# Altium footprint library WE Inductors.PcbLib: 131 footprints (part 2 of 9)
Each footprint in its own frame and in the unit in brackets; x right, y up, seen from the top. Pads: shape width x height; smd on the part's side, far side on the other; paste and mask are expansions set on the pad; w line width, h text height; cw(c..) or ccw(c..) is an arc to the next point about the centre after c.
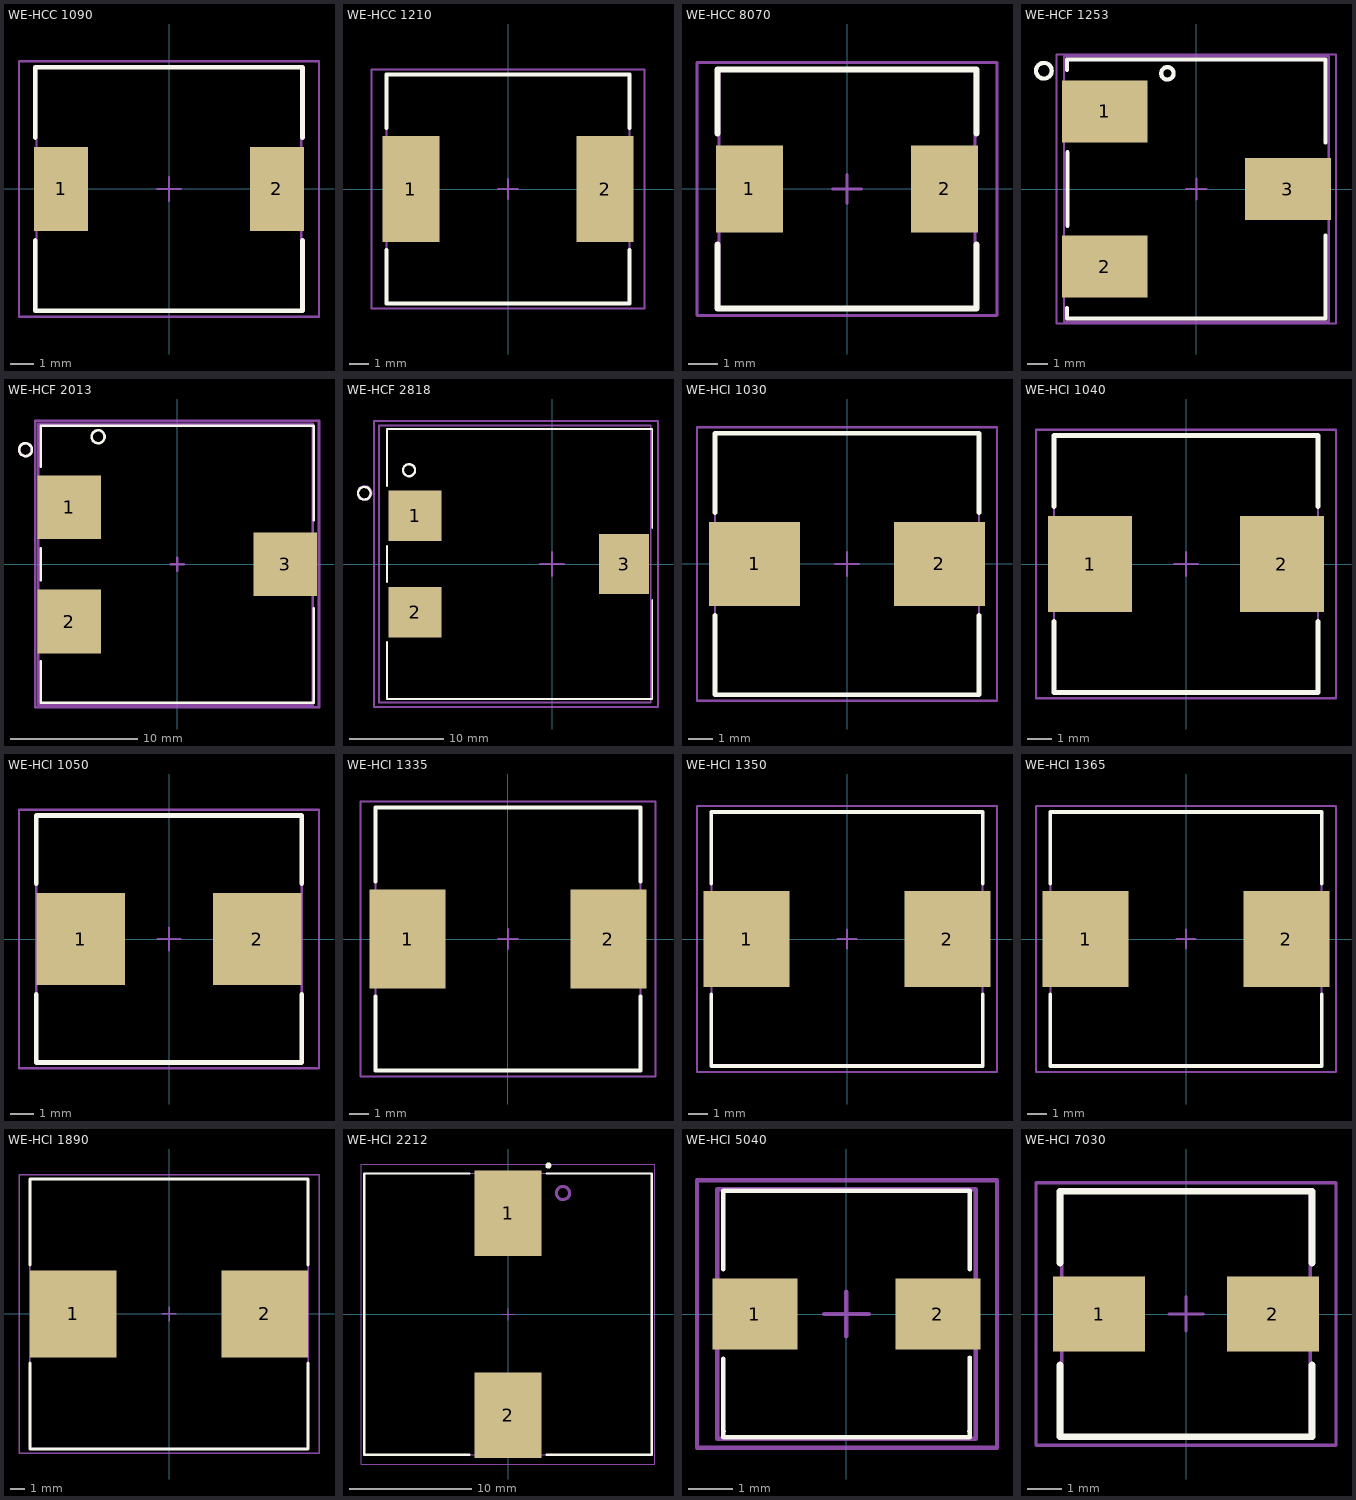
[diagram p1: the footprints below, top view; thin cyan lines are the x and y axes]

## WE-HCC 1090 [mm] "Inductor, 2-Leads, Body 10,9x10,0mm"
height 9.7
pads (2):
  rect 2.3x3.6 smd: 1(-4.6,0) 2(4.6,0)
Top Overlay:
  lines w0.2: -5.7,-2.2 -5.7,-5.2 5.7,-5.2 5.7,-2.2 ; -5.7,2.2 -5.7,5.2 5.7,5.2 5.7,2.2
Mechanical 13:
  lines w0.1: -5.65,-5.2 5.65,-5.2 5.65,5.2 -5.65,5.2 -5.65,-5.2
Mechanical 15:
  lines w0.1: -0.5,0 0.5,0 ; 0,-0.5 0,0.5 ; -6.4,-5.45 6.4,-5.45 6.4,5.45 -6.4,5.45 -6.4,-5.45
3D body: height 9.29, standoff -0.01, extent -5.125,-5 5.125,5

## WE-HCC 1210 [mm] "Inductor, 2-Leads, Body 12,1x11,4mm"
height 10
pads (2):
  rect 2.9x5.4 smd: 1(-4.95,0) 2(4.95,0)
Top Overlay:
  lines w0.2: -6.2,-3.1 -6.2,-5.85 6.2,-5.85 6.2,-3.1 ; -6.2,3.1 -6.2,5.85 6.2,5.85 6.2,3.1
Mechanical 13:
  lines w0.1: -6.2,-5.85 6.2,-5.85 6.2,5.85 -6.2,5.85 -6.2,-5.85
Mechanical 15:
  lines w0.1: -0.5,0 0.5,0 ; 0,-0.5 0,0.5 ; -6.95,-6.1 6.95,-6.1 6.95,6.1 -6.95,6.1 -6.95,-6.1
3D body: height 9.5, standoff 0, extent -6.05,-5.685 6.05,5.715

## WE-HCC 8070 [mm] "Inductor, 2-Leads, Body 8,4x7,9mm"
height 7.5
pads (2):
  rect 2.3x3 smd: 1(-3.35,0) 2(3.35,0)
Top Overlay:
  lines w0.2: -4.45,-1.9 -4.45,-4.1 4.45,-4.1 4.45,-1.9 ; -4.45,1.9 -4.45,4.1 4.45,4.1 4.45,1.9
Mechanical 13:
  lines w0.1: -4.4,-4.1 -4.4,4.1 4.4,4.1 4.4,-4.1 -4.4,-4.1
Mechanical 15:
  lines w0.1: -0.5,0 0.5,0 ; 0,-0.5 0,0.5 ; -5.15,-4.35 -5.15,4.35 5.15,4.35 5.15,-4.35 -5.15,-4.35
3D body: height 7.15, standoff -0.05, extent -4.2,-3.963 4.2,3.937

## WE-HCF 1253 [mm] "SMD Inductor, 3-Leads, Body 12.6x12.6mm (max)"
height 5.3
pads (3):
  rect 4.15x3 smd: 1(-4.425,3.75) 2(-4.425,-3.75) 3(4.425,0)
Top Overlay:
  circle w0.2: c-7.366,5.715 r0.381
  circle w0.2: c-1.397,5.588 r0.3
  lines w0.2: -6.25,-5.742 -6.25,-6.25 6.25,-6.25 6.25,-2.25 ; -6.25,5.742 -6.25,6.25 6.25,6.25 6.25,2.25 ; -6.223,-1.778 -6.223,1.778
Mechanical 13:
  lines w0.1: -6.4,-6.4 -6.4,6.4 6.4,6.4 6.4,-6.4 -6.4,-6.4
Mechanical 15:
  lines w0.1: -0.5,0 0.5,0 ; 0,-0.5 0,0.5 ; -6.75,-6.5 -6.75,6.5 6.75,6.5 6.75,-6.5 -6.75,-6.5
  text ".Designator" at 0,0 h0.76
3D body: height 5.1, standoff 0.1, extent -6.25,-6.25 6.25,6.25

## WE-HCF 2013 [mm] "SMD Inductor, 3-Leads, Body 21,8x21,5mm (max)"
height 14.5
pads (3):
  rect 5x5 smd: 1(-8.5,4.5) 2(-8.5,-4.5) 3(8.5,0)
Top Overlay:
  circle w0.2: c-6.223,10.033 r0.508
  circle w0.2: c-11.938,9.017 r0.508
  lines w0.2: -10.75,-7.62 -10.75,-10.9 10.75,-10.9 10.75,-3.45 ; -10.75,-1.27 -10.75,1.27 ; -10.75,7.665 -10.75,10.9 10.75,10.9 10.75,3.45
Mechanical 13:
  lines w0.2: -10.922,-11.049 -10.922,11.049 10.668,11.049 10.668,-11.049 -10.922,-11.049
Mechanical 15:
  circle w0.2: c-11.938,9.017 r0.508
  lines w0.2: -0.5,0 0.5,0 ; 0,-0.5 0,0.5 ; -11.15,-11.25 -11.15,11.3 11.15,11.3 11.15,-11.25 -11.15,-11.25
  text ".Designator" at 0,0 h0.76
3D body: height 13.98, standoff -0.02, extent -10.6,-10.75 10.4,10.75

## WE-HCF 2818 [mm] "SMD Inductor, 3-Leads, Body 21,5x28mm (max)"
height 18
pads (3):
  rect 5.59x5.33 smd: 1(-14.465,5.075) 2(-14.465,-5.075)
  rect 5.28x6.35 smd: 3(7.61,0)
Top Overlay:
  circle w0.25: c-15.112,9.906 r0.635
  circle w0.25: c-19.836,7.47 r0.665
  lines w0.2: -17.427,-8.255 -17.427,-14.25 10.573,-14.25 10.573,-3.81 ; -17.427,-1.905 -17.427,1.905 ; -17.427,8.255 -17.427,14.25 -3.45,14.25 ; -3.927,14.25 10.573,14.25 10.573,3.81
Mechanical 13:
  lines w0.2: -18.287,-14.605 -18.287,14.605 10.415,14.605 10.415,-14.605 -18.287,-14.605
Mechanical 15:
  circle w0.25: c-19.8,7.5 r0.7
  lines w0.2: -1.282,0.005 1.258,0.005 ; 0,-1.27 0,1.27 ; -18.795,-15.113 -18.795,15.113 11.177,15.113 11.177,-15.113 -18.795,-15.113
  text ".Designator" at -0.03,-0.01 h0.76
3D body: height 18.75, standoff 0.25, extent -17.918,-14.25 10.082,14.25

## WE-HCI 1030 [mm] "SMD Inductor, 2-Leads, Body 10,6x10,6mm"
height 3.1
pads (2):
  rect 3.8x3.5 smd: 1(-3.85,0) 2(3.85,0)
Top Overlay:
  lines w0.2: -5.5,-2.15 -5.5,-5.45 5.5,-5.45 5.5,-2.15 ; -5.5,2.15 -5.5,5.45 5.5,5.45 5.5,2.15
Mechanical 13:
  lines w0.1: -5.5,-5.45 5.5,-5.45 5.5,5.45 -5.5,5.45 -5.5,-5.45
Mechanical 15:
  lines w0.1: -0.5,0 0.5,0 ; 0,-0.5 0,0.5 ; -6.25,-5.7 6.25,-5.7 6.25,5.7 -6.25,5.7 -6.25,-5.7
  text ".Designator" at 0,0 h0.76
3D body: height 2.8, standoff -0.01, extent -5.3,-5.3 5.3,5.3

## WE-HCI 1040 [mm] "Inductor, 2-Leads, Body 10,5x10,2mm"
height 4.2
pads (2):
  rect 3.5x4 smd: 1(-4,0) 2(4,0)
Top Overlay:
  lines w0.2: -5.5,-2.4 -5.5,-5.35 5.5,-5.35 5.5,-2.4 ; -5.5,2.4 -5.5,5.35 5.5,5.35 5.5,2.4
Mechanical 13:
  lines w0.1: -5.5,-5.35 -5.5,5.35 5.5,5.35 5.5,-5.35 -5.5,-5.35
Mechanical 15:
  lines w0.1: -0.5,0 0.5,0 ; 0,-0.5 0,0.5 ; -6.25,-5.6 -6.25,5.6 6.25,5.6 6.25,-5.6 -6.25,-5.6
  text ".Designator" at 0,0 h0.76
3D body: height 3.99, standoff -0.01, extent -5.25,-5.1 5.25,5.1

## WE-HCI 1050 [mm] "SMD Inductor, 2-Leads, Body 10,5x10,2mm"
height 5
pads (2):
  rect 3.85x4 smd: 1(-3.825,0) 2(3.825,0)
Top Overlay:
  lines w0.2: -5.75,-2.4 -5.75,-5.35 5.75,-5.35 5.75,-2.4 ; -5.75,2.4 -5.75,5.35 5.75,5.35 5.75,2.4
Mechanical 13:
  lines w0.1: -5.75,-5.35 5.75,-5.35 5.75,5.35 -5.75,5.35 -5.75,-5.35
Mechanical 15:
  lines w0.1: -0.5,0 0.5,0 ; 0,-0.5 0,0.5 ; -6.5,-5.6 6.5,-5.6 6.5,5.6 -6.5,5.6 -6.5,-5.6
  text ".Designator" at 0,0 h0.76
3D body: height 5, standoff 0, extent -5.5,-5.1 5.5,5.1

## WE-HCI 1335 [mm] "SMD Inductor, 2-Leads, Body 12,9x12,8mm"
height 3.5
pads (2):
  rect 3.85x5 smd: 1(-5.075,0) 2(5.075,0)
Top Overlay:
  lines w0.2: -6.7,-2.9 -6.7,-6.65 6.7,-6.65 6.7,-2.9 ; -6.7,2.9 -6.7,6.65 6.7,6.65 6.7,2.9
Mechanical 13:
  lines w0.1: -6.7,-6.65 -6.7,6.65 6.7,6.65 6.7,-6.65 -6.7,-6.65
Mechanical 15:
  lines w0.1: -0.5,0 0.5,0 ; 0,-0.5 0,0.5 ; -7.45,-6.95 -7.45,6.95 7.45,6.95 7.45,-6.95 -7.45,-6.95
  text ".Designator" at 0,-0.025 h0.76
3D body: height 3.5, standoff 0, extent -6.45,-6.4 6.45,6.4

## WE-HCI 1350 [mm] "Inductor, 2-Leads, Body 13,0x12,8mm"
height 5
pads (2):
  rect 4.5x5 smd: 1(-5.25,0) 2(5.25,0)
Top Overlay:
  lines w0.2: -7.1,-2.9 -7.1,-6.65 7.1,-6.65 7.1,-2.9 ; -7.1,2.9 -7.1,6.65 7.1,6.65 7.1,2.9
Mechanical 13:
  lines w0.1: -7.1,-6.65 -7.1,6.65 7.1,6.65 7.1,-6.65 -7.1,-6.65
Mechanical 15:
  lines w0.1: -0.5,0 0.5,0 ; 0,-0.5 0,0.5 ; -7.85,-6.95 -7.85,6.95 7.85,6.95 7.85,-6.95 -7.85,-6.95
  text ".Designator" at -0.025,0 h0.76
3D body: height 4.99, standoff -0.01, extent -6.999,-6.4 6.999,6.4

## WE-HCI 1365 [mm] "Inductor, 2-Leads, Body 13,2x12,8mm"
height 6.5
pads (2):
  rect 4.5x5 smd: 1(-5.25,0) 2(5.25,0)
Top Overlay:
  lines w0.2: -7.1,-2.9 -7.1,-6.65 7.1,-6.65 7.1,-2.9 ; -7.1,2.9 -7.1,6.65 7.1,6.65 7.1,2.9
Mechanical 13:
  lines w0.1: -7.1,-6.65 7.1,-6.65 7.1,6.65 -7.1,6.65 -7.1,-6.65
Mechanical 15:
  lines w0.1: -0.5,0 0.5,0 ; 0,-0.5 0,0.5 ; -7.85,-6.95 7.85,-6.95 7.85,6.95 -7.85,6.95 -7.85,-6.95
  text ".Designator" at 0,0 h0.76
3D body: height 6.49, standoff -0.01, extent -7.1,-6.4 7.1,6.4

## WE-HCI 1890 [mm] "Inductor, 2-Leads, Body 18,3x18,2mm"
height 9.2
pads (2):
  rect 6x6 smd: 1(-6.65,0) 2(6.65,0)
Top Overlay:
  lines w0.2: -9.65,-3.4 -9.65,-9.35 9.65,-9.35 9.65,-3.4 ; -9.65,3.4 -9.65,9.35 9.65,9.35 9.65,3.4
Mechanical 13:
  lines w0.1: -9.65,-9.35 -9.65,9.35 9.65,9.35 9.65,-9.35 -9.65,-9.35
Mechanical 15:
  lines w0.1: -0.5,0 0.5,0 ; 0,-0.5 0,0.5 ; -10.4,-9.65 -10.4,9.65 10.4,9.65 10.4,-9.65 -10.4,-9.65
  text ".Designator" at 0,0 h0.76
3D body: height 8.85, standoff -0.05, extent -9.15,-9.1 9.15,9.1

## WE-HCI 2212 [mm] "High Current Inductor, 2-Leads, Body 22.0x22.5mm"
height 12.4
pads (2):
  rect 5.5x7 smd: 1(0,8.25) 2(0,-8.25)
Top Overlay:
  circle w0.25: c3.3,12.15 r0.125
  lines w0.2: -3.15,-11.5 -11.75,-11.5 -11.75,11.5 -3.15,11.5 ; 3.15,-11.5 11.75,-11.5 11.75,11.5 3.15,11.5
Mechanical 13:
  circle w0.254: c4.5,9.9 r0.539
  lines w0.1: -11.75,-11.5 11.75,-11.5 11.75,11.5 -11.75,11.5 -11.75,-11.5
Mechanical 15:
  lines w0.1: -0.5,0 0.5,0 ; 0,-0.5 0,0.5 ; -12,-12.25 12,-12.25 12,12.25 -12,12.25 -12,-12.25
  text ".Designator" at 0,0 h0.76
3D body: height 12, standoff 0, extent -11,-11.25 11,11.25

## WE-HCI 5040 [mm] "SMD Inductor, 2-Leads, Body 5.5x5.2mm"
height 4
pads (2):
  rect 1.9x1.6 smd: 1(-2.05,0) 2(2.05,0)
Top Overlay:
  lines w0.1: -2.76,-2.615 -2.75,-2.625 ; -2.76,-1 -2.76,-2.76 2.76,-2.76 2.76,-0.975 ; -2.76,1 -2.76,2.76 2.76,2.76 ; 2.75,2.75 2.76,2.76 ; 2.76,1 2.76,2.76 ; 2.75,-2.625 2.75,-2.625
Mechanical 13:
  lines w0.1: -2.9,-2.8 -2.9,2.8 2.9,2.8 2.9,-2.8 -2.9,-2.8
Mechanical 15:
  lines w0.1: -0.5,0 0.5,0 ; 0,-0.5 0,0.5 ; -3.35,-3 -3.35,3 3.375,3 3.375,-3 -3.35,-3
  text ".Designator" at 0,0 h0.76
3D body: height 3.95, standoff 0, extent -2.79,-2.65 2.79,2.65

## WE-HCI 7030 [mm] "SMD Inductor, 2-Leads, Body 7,0x6,9mm"
height 3.3
pads (2):
  rect 2.7x2.2 smd: 1(-2.55,0) 2(2.55,0)
Top Overlay:
  lines w0.2: -3.7,-1.5 -3.7,-3.6 3.7,-3.6 3.7,-1.5 ; -3.7,1.5 -3.7,3.6 3.7,3.6 3.7,1.5
Mechanical 13:
  lines w0.1: -3.65,-3.6 3.65,-3.6 3.65,3.6 -3.65,3.6 -3.65,-3.6
Mechanical 15:
  lines w0.1: -0.5,0 0.5,0 ; 0,-0.5 0,0.5 ; -4.4,-3.85 4.4,-3.85 4.4,3.85 -4.4,3.85 -4.4,-3.85
  text ".Designator" at 0,0 h0.76
3D body: height 2.98, standoff -0.02, extent -3.5,-3.45 3.5,3.45